# Altium footprint library Supernova Connectors.PcbLib: 303 footprints (part 18 of 19)
Each footprint in its own frame and in the unit in brackets; x right, y up, seen from the top. Pads: shape width x height; smd on the part's side, far side on the other; paste and mask are expansions set on the pad; w line width, h text height; cw(c..) or ccw(c..) is an arc to the next point about the centre after c.
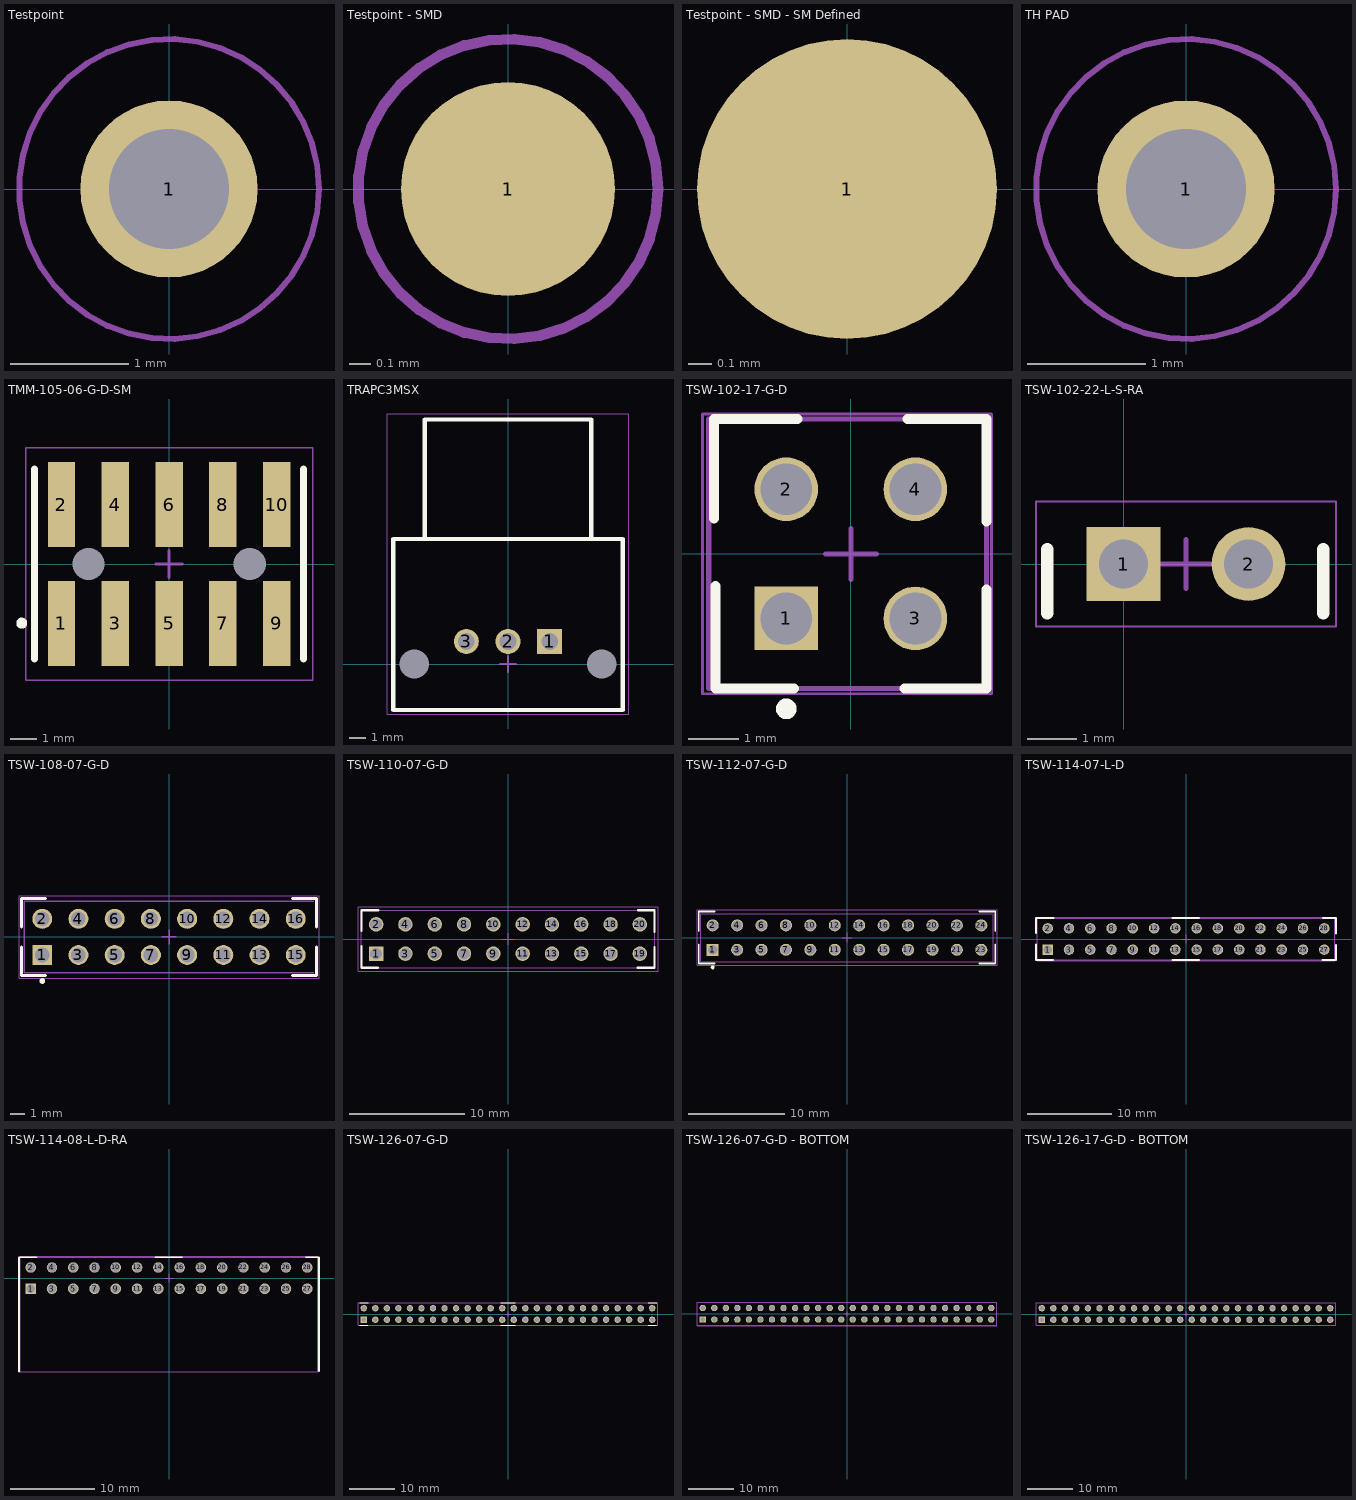
[diagram p17: the footprints below, top view; thin cyan lines are the x and y axes]

## Testpoint [mm]
pads (1):
  round 1.5 hole 1.02: 1(0,0)
Top Courtyard:
  circle w0.05: c0,0 r1.27

## Testpoint - SMD [mm]
pads (1):
  round 1 smd paste-2: 1(0,0)
Top Courtyard:
  circle w0.05: c0,0 r0.7

## Testpoint - SMD - SM Defined [mm]
pads (1):
  round 1.3 smd paste-2 mask+0.102: 1(0,0)
Top Solder:
  region: 0,-0.5 -0.099,-0.5 -0.283,-0.424 -0.424,-0.283 -0.5,-0.099 -0.5,0 -0.5,0.099 -0.424,0.283 -0.283,0.424 -0.099,0.5 0,0.5 0.099,0.5 0.283,0.424 0.424,0.283 0.5,0.099 0.5,0 0.5,-0.099 0.424,-0.283 0.283,-0.424 0.099,-0.5

## TH PAD [mm]
pads (1):
  round 1.5 hole 1.02: 1(0,0)
Top Courtyard:
  circle w0.05: c0,0 r1.27

## TMM-105-06-G-D-SM [mm]
pads (12):
  rect 1.02x3.15 smd: 1(-4,-2.21) 2(-4,2.21) 3(-2,-2.21) 4(-2,2.21) 5(0,-2.21) 6(0,2.21) 7(2,-2.21) 8(2,2.21) 9(4,-2.21) 10(4,2.21)
  round 0 hole 1.19 unplated: ""(-3,0) ""(3,0)
Top Overlay:
  circle w0.203: c-5.478,-2.2 r0.102
  lines w0.254: -5.004,-3.531 -5.004,3.531 ; 5.004,-3.531 5.004,3.531
Top Courtyard:
  lines w0.05: -5.334,-4.318 5.334,-4.318 5.334,4.318 -5.334,4.318 -5.334,-4.318
  lines w0.1: -0.5,0 0.5,0 ; 0,-0.5 0,0.5
3D body "TMM-105-06-L-D-SM-A.stp": height 7.04, standoff -1.02, extent -5,-3.53 5,3.531

## TRAPC3MSX [mil]
pads (5):
  rect 60x60 hole 40: 1(100,54)
  round 60 hole 40: 2(0,54) 3(-100,54)
  round 59.06 hole 70 unplated: ""(-225,0) ""(225,0)
Top Overlay:
  lines w10: -200,300 -200,586.61 200,586.61 200,300 ; -275.59,-110.24 275.59,-110.24 275.59,-50 275.59,300 -275.59,300 -275.59,-50 -275.59,-110.24
Top Courtyard:
  lines w1.97: -290,-120 290,-120 290,600 -290,600 -290,-120
  lines w3.94: -19.68,0 19.68,0 ; 0,-19.68 0,19.69
3D body "TRAPC3MSX.STEP": height 452, standoff -123, extent -265,-105 265,581

## TSW-102-17-G-D [mm] "TSW-102-17-G-D"
height 11.05
pads (4):
  rect 1.25x1.25 hole 1.02: 1(-1.27,-1.27)
  round 1.25 hole 1.02: 2(-1.27,1.27) 3(1.27,-1.27) 4(1.27,1.27)
Top Overlay:
  circle w0.203: c-1.27,-3.048 r0.102
  lines w0.2: -2.694,0.7 -2.694,2.65 -1.055,2.65 ; -2.664,-0.635 -2.664,-2.65 -1.12,-2.65 ; 1.055,-2.65 2.666,-2.65 2.666,-0.7 ; 1.12,2.65 2.666,2.65 2.666,0.635
Top 3D Body:
  lines w0.1: -2.794,-2.65 2.666,-2.65 2.666,2.65 -2.794,2.65 -2.794,-2.65
Top Courtyard:
  lines w0.05: -2.916,-2.75 2.766,-2.75 2.766,2.75 -2.916,2.75 -2.916,-2.75
  lines w0.1: -0.5,0 0.5,0 ; 0,-0.5 0,0.5
3D body "TSW-102-17-G-D.stp": height 18.29, standoff -2.79, extent -2.54,-2.54 2.54,2.54

## TSW-102-22-L-S-RA [mm] "Connector; Header; 3 Position; Right Angle. Through hole"
pads (2):
  rect 1.5x1.5 hole 1: 1(0,0)
  round 1.5 hole 1: 2(2.54,0)
Top Overlay:
  lines w0.254: -1.554,-1 -1.554,0.3 ; 4.054,-1 4.054,0.3
Top Courtyard:
  lines w0.05: -1.778,-1.27 -1.778,1.27 4.318,1.27 4.318,-1.27 -1.778,-1.27
  lines w0.1: 0.77,0 1.77,0 ; 1.27,-0.5 1.27,0.5
3D body "TSW-102-22-L-S-RA.stp": height 5.87, standoff -1.98, extent -1.27,-9.906 3.81,0.318

## TSW-108-07-G-D [mm] "ESQ-126-37-G-D Samtech 52-pin connector"
height 11.05
pads (16):
  rect 1.4x1.4 hole 1.02: 1(-8.89,-1.27)
  round 1.4 hole 1.02: 2(-8.89,1.27) 3(-6.35,-1.27) 4(-6.35,1.27) 5(-3.81,-1.27) 6(-3.81,1.27) 7(-1.27,-1.27) 8(-1.27,1.27) 9(1.27,-1.27) 10(1.27,1.27) 11(3.81,-1.27) 12(3.81,1.27) 13(6.35,-1.27) 14(6.35,1.27) 15(8.89,-1.27) 16(8.89,1.27)
Top Overlay:
  circle w0.203: c-8.89,-3.094 r0.102
  lines w0.2: -10.34,-0.7 -10.34,-2.7 -8.675,-2.7 ; -10.34,0.7 -10.34,2.7 -8.675,2.7 ; 8.675,-2.7 10.34,-2.7 10.34,-0.7 ; 8.675,2.7 10.34,2.7 10.34,0.7
Top 3D Body:
  lines w0.1: 10.14,-2.5 -10.14,-2.5 -10.14,2.5 10.14,2.5
Top Courtyard:
  lines w0.05: -10.522,-2.9 -10.522,2.9 10.522,2.9 10.522,-2.9 -10.522,-2.9
  lines w0.1: -0.5,0 0.5,0 ; 0,-0.5 0,0.5
3D body "TSW-108-07-G-D.stp": height 8.38, standoff -2.54, extent -10.16,-2.54 10.16,2.54

## TSW-110-07-G-D [mm] "TSW-110-07-G-D"
height 11.05
pads (20):
  rect 1.25x1.25 hole 1.02: 1(-11.43,-1.27)
  round 1.25 hole 1.02: 2(-11.43,1.27) 3(-8.89,-1.27) 4(-8.89,1.27) 5(-6.35,-1.27) 6(-6.35,1.27) 7(-3.81,-1.27) 8(-3.81,1.27) 9(-1.27,-1.27) 10(-1.27,1.27) 11(1.27,-1.27) 12(1.27,1.27) 13(3.81,-1.27) 14(3.81,1.27) 15(6.35,-1.27) 16(6.35,1.27) 17(8.89,-1.27) 18(8.89,1.27) 19(11.43,-1.27) 20(11.43,1.27)
Top Overlay:
  lines w0.2: -12.7,-0.635 -12.7,-2.5 -11.28,-2.5 ; -12.7,0.7 -12.7,2.5 -11.215,2.5 ; 11.215,-2.5 12.7,-2.5 12.7,-0.7 ; 11.28,2.5 12.7,2.5 12.7,0.635
Top 3D Body:
  lines w0.1: -12.7,-2.5 -12.7,2.5 12.7,2.5 12.7,-2.5 -12.7,-2.5
Top Courtyard:
  lines w0.05: -13,-2.794 13,-2.794 13,2.794 -13,2.794 -13,-2.794
  lines w0.1: -0.5,0 0.5,0 ; 0,-0.5 0,0.5
3D body "TSW-110-07-G-D.stp": height 8.38, standoff -2.54, extent -12.7,-2.54 12.7,2.54

## TSW-112-07-G-D [mm] "ESQ-126-37-G-D Samtech 52-pin connector"
height 11.05
pads (24):
  rect 1.25x1.25 hole 1.02: 1(-13.97,-1.27)
  round 1.25 hole 1.02: 2(-13.97,1.27) 3(-11.43,-1.27) 4(-11.43,1.27) 5(-8.89,-1.27) 6(-8.89,1.27) 7(-6.35,-1.27) 8(-6.35,1.27) 9(-3.81,-1.27) 10(-3.81,1.27) 11(-1.27,-1.27) 12(-1.27,1.27) 13(1.27,-1.27) 14(1.27,1.27) 15(3.81,-1.27) 16(3.81,1.27) 17(6.35,-1.27) 18(6.35,1.27) 19(8.89,-1.27) 20(8.89,1.27) 21(11.43,-1.27) 22(11.43,1.27) 23(13.97,-1.27) 24(13.97,1.27)
Top Overlay:
  circle w0.203: c-13.97,-3.094 r0.102
  lines w0.2: -15.42,-0.7 -15.42,-2.7 -13.755,-2.7 ; -15.42,0.7 -15.42,2.7 -13.755,2.7 ; 13.755,-2.7 15.42,-2.7 15.42,-0.7 ; 13.755,2.7 15.42,2.7 15.42,0.7
Top 3D Body:
  lines w0.1: -15.22,-2.5 15.22,-2.5 15.22,2.5 -15.22,2.5 -15.22,-2.5
Top Courtyard:
  lines w0.05: -15.602,-2.9 15.602,-2.9 15.602,2.9 -15.602,2.9 -15.602,-2.9
  lines w0.1: -0.5,0 0.5,0 ; 0,-0.5 0,0.5
3D body "TSW-112-07-G-D.stp": height 8.38, standoff -2.54, extent -15.24,-2.54 15.24,2.54

## TSW-114-07-L-D [mm] "TSW-114-07-L-D"
height 11.05
pads (28):
  rect 1.25x1.25 hole 1.02: 1(-16.51,-1.27)
  round 1.25 hole 1.02: 2(-16.51,1.27) 3(-13.97,-1.27) 4(-13.97,1.27) 5(-11.43,-1.27) 6(-11.43,1.27) 7(-8.89,-1.27) 8(-8.89,1.27) 9(-6.35,-1.27) 10(-6.35,1.27) 11(-3.81,-1.27) 12(-3.81,1.27) 13(-1.27,-1.27) 14(-1.27,1.27) 15(1.27,-1.27) 16(1.27,1.27) 17(3.81,-1.27) 18(3.81,1.27) 19(6.35,-1.27) 20(6.35,1.27) 21(8.89,-1.27) 22(8.89,1.27) 23(11.43,-1.27) 24(11.43,1.27) 25(13.97,-1.27) 26(13.97,1.27) 27(16.51,-1.27) 28(16.51,1.27)
Top Overlay:
  lines w0.2: -17.907,-0.635 -17.907,-2.5 -15.852,-2.5 ; -17.907,0.7 -17.907,2.5 -15.787,2.5 ; -1.602,-2.5 1.6,-2.5 ; -1.602,2.5 1.6,2.5 ; 16.295,-2.5 17.907,-2.5 17.907,-0.7 ; 16.36,2.5 17.907,2.5 17.907,0.635
Top 3D Body:
  lines w0.1: -17.78,-2.5 -17.78,2.5 17.78,2.5 17.78,-2.5 -17.78,-2.5
Top Courtyard:
  lines w0.05: -17.752,-2.6 -17.752,2.6 17.78,2.6 17.78,-2.6 -17.752,-2.6
  lines w0.1: -0.5,0 0.5,0 ; 0,-0.5 0,0.5
3D body "TSW-114-07-L-D.stp": height 8.38, standoff -2.54, extent -17.78,-2.54 17.78,2.54

## TSW-114-08-L-D-RA [mm] "TSW-114-07-L-D"
height 11.05
pads (28):
  rect 1.25x1.25 hole 1.02: 1(-16.51,-1.27)
  round 1.25 hole 1.02: 2(-16.51,1.27) 3(-13.97,-1.27) 4(-13.97,1.27) 5(-11.43,-1.27) 6(-11.43,1.27) 7(-8.89,-1.27) 8(-8.89,1.27) 9(-6.35,-1.27) 10(-6.35,1.27) 11(-3.81,-1.27) 12(-3.81,1.27) 13(-1.27,-1.27) 14(-1.27,1.27) 15(1.27,-1.27) 16(1.27,1.27) 17(3.81,-1.27) 18(3.81,1.27) 19(6.35,-1.27) 20(6.35,1.27) 21(8.89,-1.27) 22(8.89,1.27) 23(11.43,-1.27) 24(11.43,1.27) 25(13.97,-1.27) 26(13.97,1.27) 27(16.51,-1.27) 28(16.51,1.27)
Top Overlay:
  lines w0.2: -17.907,-11.163 -17.907,2.5 -15.787,2.5 ; -1.602,2.5 1.6,2.5 ; 16.36,2.5 17.907,2.5 17.907,-11.1
Top 3D Body:
  lines w0.1: -17.78,-11.163 -17.78,2.5 17.78,2.5 17.78,-11.163 -17.78,-11.163
Top Courtyard:
  lines w0.05: -17.752,-11.163 17.78,-11.163 17.78,2.6 -17.752,2.6 -17.752,-11.163
  lines w0.1: -0.5,0 0.5,0 ; 0,-0.5 0,0.5
3D body "TSW-114-08-G-D-RA.stp": height 5.64, standoff -2.21, extent -17.78,-11.163 17.78,1.6

## TSW-126-07-G-D [mm] "TSW-126-07-G-D Samtech 52-pin connector"
height 11.05
pads (52):
  rect 1.4x1.4 hole 1.02: 1(-31.75,-1.27)
  round 1.4 hole 1.02: 2(-31.75,1.27) 3(-29.21,-1.27) 4(-29.21,1.27) 5(-26.67,-1.27) 6(-26.67,1.27) 7(-24.13,-1.27) 8(-24.13,1.27) 9(-21.59,-1.27) 10(-21.59,1.27) 11(-19.05,-1.27) 12(-19.05,1.27) 13(-16.51,-1.27) 14(-16.51,1.27) 15(-13.97,-1.27) 16(-13.97,1.27) 17(-11.43,-1.27) 18(-11.43,1.27) 19(-8.89,-1.27) 20(-8.89,1.27) 21(-6.35,-1.27) 22(-6.35,1.27) 23(-3.81,-1.27) 24(-3.81,1.27) 25(-1.27,-1.27) 26(-1.27,1.27) 27(1.27,-1.27) 28(1.27,1.27) 29(3.81,-1.27) 30(3.81,1.27) 31(6.35,-1.27) 32(6.35,1.27) 33(8.89,-1.27) 34(8.89,1.27) 35(11.43,-1.27) 36(11.43,1.27) 37(13.97,-1.27) 38(13.97,1.27) 39(16.51,-1.27) 40(16.51,1.27) 41(19.05,-1.27) 42(19.05,1.27) 43(21.59,-1.27) 44(21.59,1.27) 45(24.13,-1.27) 46(24.13,1.27) 47(26.67,-1.27) 48(26.67,1.27) 49(29.21,-1.27) 50(29.21,1.27) 51(31.75,-1.27) 52(31.75,1.27)
Top Overlay:
  lines w0.2: -32.638,-2.5 -30.838,-2.5 ; -32.638,2.5 -30.773,2.5 ; -1.602,-2.5 1.6,-2.5 ; -1.602,2.5 1.6,2.5 ; 30.862,-2.5 32.662,-2.5 ; 30.862,2.5 32.727,2.5
Top 3D Body:
  lines w0.1: -33.02,-2.5 33.02,-2.5 33.02,2.5 -33.02,2.5 -33.02,-2.5
Top Courtyard:
  lines w0.05: -32.992,-2.5 33.02,-2.5 33.02,2.5 -32.992,2.5 -32.992,-2.5
  lines w0.1: -0.5,0 0.5,0 ; 0,-0.5 0,0.5
3D body "Samtec-TSW-126-07-G-D.STEP": height 8.38, standoff -2.54, extent -33.02,-2.54 33.02,2.54

## TSW-126-07-G-D - BOTTOM [mm] "TSW-126-07-G-D Samtech 52-pin connector"
height 11.05
pads (52):
  rect 1.4x1.4 hole 1.02: 1(-31.75,-1.27)
  round 1.4 hole 1.02: 2(-31.75,1.27) 3(-29.21,-1.27) 4(-29.21,1.27) 5(-26.67,-1.27) 6(-26.67,1.27) 7(-24.13,-1.27) 8(-24.13,1.27) 9(-21.59,-1.27) 10(-21.59,1.27) 11(-19.05,-1.27) 12(-19.05,1.27) 13(-16.51,-1.27) 14(-16.51,1.27) 15(-13.97,-1.27) 16(-13.97,1.27) 17(-11.43,-1.27) 18(-11.43,1.27) 19(-8.89,-1.27) 20(-8.89,1.27) 21(-6.35,-1.27) 22(-6.35,1.27) 23(-3.81,-1.27) 24(-3.81,1.27) 25(-1.27,-1.27) 26(-1.27,1.27) 27(1.27,-1.27) 28(1.27,1.27) 29(3.81,-1.27) 30(3.81,1.27) 31(6.35,-1.27) 32(6.35,1.27) 33(8.89,-1.27) 34(8.89,1.27) 35(11.43,-1.27) 36(11.43,1.27) 37(13.97,-1.27) 38(13.97,1.27) 39(16.51,-1.27) 40(16.51,1.27) 41(19.05,-1.27) 42(19.05,1.27) 43(21.59,-1.27) 44(21.59,1.27) 45(24.13,-1.27) 46(24.13,1.27) 47(26.67,-1.27) 48(26.67,1.27) 49(29.21,-1.27) 50(29.21,1.27) 51(31.75,-1.27) 52(31.75,1.27)
Bottom Overlay:
  lines w0.2: -32.638,-2.5 -30.838,-2.5 ; -32.638,2.5 -30.773,2.5 ; -1.602,-2.5 1.6,-2.5 ; -1.602,2.5 1.6,2.5 ; 30.862,-2.5 32.662,-2.5 ; 30.862,2.5 32.727,2.5
Bottom 3D Body:
  lines w0.1: -33.02,-2.5 -33.02,2.5 33.02,2.5 33.02,-2.5 -33.02,-2.5
Bottom Courtyard:
  lines w0.1: -0.5,0 0.5,0 ; 0,-0.5 0,0.5 ; -32.992,-2.6 33.02,-2.6 33.02,2.5 -32.992,2.5 -32.992,-2.6
3D body "Samtec-TSW-126-07-G-D.STEP": height 8.41, standoff -2.51, extent -33.02,-2.54 33.02,2.54

## TSW-126-17-G-D - BOTTOM [mm] "TSW-126-17-G-D Samtech 52-pin connector"
height 11.05
pads (52):
  rect 1.4x1.4 hole 1.02: 1(-31.75,-1.27)
  round 1.4 hole 1.02: 2(-31.75,1.27) 3(-29.21,-1.27) 4(-29.21,1.27) 5(-26.67,-1.27) 6(-26.67,1.27) 7(-24.13,-1.27) 8(-24.13,1.27) 9(-21.59,-1.27) 10(-21.59,1.27) 11(-19.05,-1.27) 12(-19.05,1.27) 13(-16.51,-1.27) 14(-16.51,1.27) 15(-13.97,-1.27) 16(-13.97,1.27) 17(-11.43,-1.27) 18(-11.43,1.27) 19(-8.89,-1.27) 20(-8.89,1.27) 21(-6.35,-1.27) 22(-6.35,1.27) 23(-3.81,-1.27) 24(-3.81,1.27) 25(-1.27,-1.27) 26(-1.27,1.27) 27(1.27,-1.27) 28(1.27,1.27) 29(3.81,-1.27) 30(3.81,1.27) 31(6.35,-1.27) 32(6.35,1.27) 33(8.89,-1.27) 34(8.89,1.27) 35(11.43,-1.27) 36(11.43,1.27) 37(13.97,-1.27) 38(13.97,1.27) 39(16.51,-1.27) 40(16.51,1.27) 41(19.05,-1.27) 42(19.05,1.27) 43(21.59,-1.27) 44(21.59,1.27) 45(24.13,-1.27) 46(24.13,1.27) 47(26.67,-1.27) 48(26.67,1.27) 49(29.21,-1.27) 50(29.21,1.27) 51(31.75,-1.27) 52(31.75,1.27)
Bottom Overlay:
  lines w0.2: -32.638,-2.5 -30.838,-2.5 ; -32.638,2.5 -30.773,2.5 ; -1.602,-2.5 1.6,-2.5 ; -1.602,2.5 1.6,2.5 ; 30.862,-2.5 32.662,-2.5 ; 30.862,2.5 32.727,2.5
Bottom 3D Body:
  lines w0.1: -33.02,-2.5 33.02,-2.5 33.02,2.5 -33.02,2.5 -33.02,-2.5
Bottom Courtyard:
  lines w0.1: -0.5,0 0.5,0 ; 0,-0.5 0,0.5 ; -32.992,-2.5 33.02,-2.5 33.02,2.5 -32.992,2.5 -32.992,-2.5
3D body "TSW-126-17-G-D.stp": height 18.31, standoff -2.77, extent -33.02,-2.54 33.02,2.54